# Altium footprint library eLIB.PcbLib: 206 footprints (part 7 of 13)
Each footprint in its own frame and in the unit in brackets; x right, y up, seen from the top. Pads: shape width x height; smd on the part's side, far side on the other; paste and mask are expansions set on the pad; w line width, h text height; cw(c..) or ccw(c..) is an arc to the next point about the centre after c.
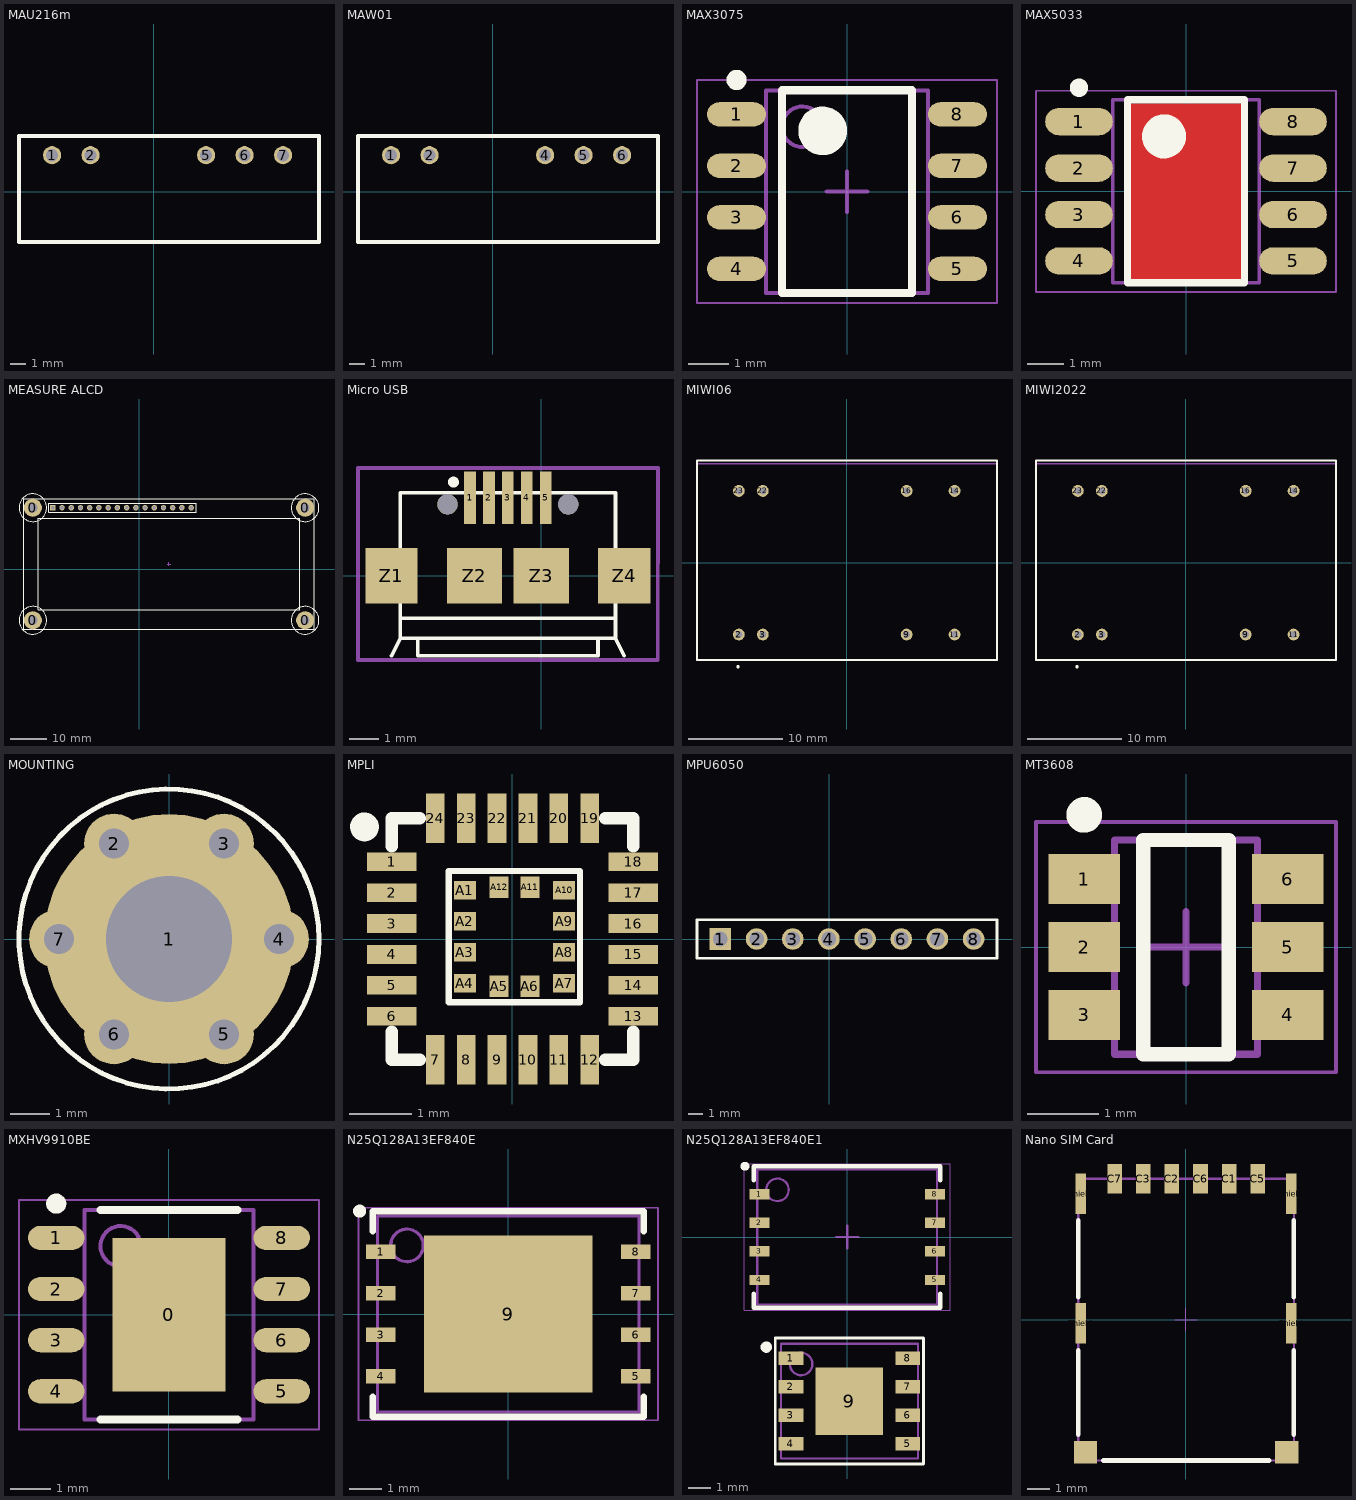
[diagram p6: the footprints below, top view; thin cyan lines are the x and y axes]

## MAU216m [mm]
pads (5):
  round 1.2 hole 0.8: 1(-6.7,2.4) 2(-4.16,2.4) 5(3.46,2.4) 6(6,2.4) 7(8.54,2.4)
Top Overlay:
  lines w0.254: -8.88,-3.33 -8.88,3.67 10.91,3.67 10.91,-3.33 -8.88,-3.33
3D body "User Library-MAU.STEP": height 10.4, standoff -3, extent -8.73,-2.74 10.77,3.46

## MAW01 [mm]
pads (5):
  round 1.2 hole 0.8: 1(-6.7,2.4) 2(-4.16,2.4) 4(3.46,2.4) 5(6,2.4) 6(8.54,2.4)
Top Overlay:
  lines w0.254: -8.88,-3.33 10.91,-3.33 10.91,3.67 -8.88,3.67 -8.88,-3.33
3D body "User Library-MAU.STEP": height 10.4, standoff -3, extent -8.73,-2.74 10.77,3.46

## MAX3075 [mm]
pads (8):
  oval 1.45x0.6 smd: 1(-2.725,1.905) 2(-2.725,0.635) 3(-2.725,-0.635) 4(-2.725,-1.905) 5(2.725,-1.905) 6(2.725,-0.635) 7(2.725,0.635) 8(2.725,1.905)
Top Overlay:
  circle w0.6: c-0.6,1.5 r0.3
  circle w0.25: c-2.725,2.755 r0.125
  lines w0.2: -1.6,-2.5 1.6,-2.5 1.6,2.5 -1.6,2.5 -1.6,-2.5
Mechanical 13:
  circle w0.1: c-1.1,1.6 r0.5
  lines w0.1: -2,-2.5 2,-2.5 2,2.5 -2,2.5 -2,-2.5
Mechanical 15:
  lines w0.05: -3.7,-2.75 3.7,-2.75 3.7,2.75 -3.7,2.75 -3.7,-2.75
  lines w0.1: -0.5,0 0.5,0 ; 0,-0.5 0,0.5
3D body: height 1.75, standoff 0.1, extent -2,-2.5 2,2.5

## MAX5033 [mm] "SOIC, 8-Leads, Body 4.90x3.90mm, Pitch 1.27mm, IPC Medium Density"
height 1.35
pads (8):
  oval 1.85x0.75 smd: 1(-2.925,1.905) 2(-2.925,0.635) 3(-2.925,-0.635) 4(-2.925,-1.905) 5(2.925,-1.905) 6(2.925,-0.635) 7(2.925,0.635) 8(2.925,1.905)
Top Layer:
  rectangle: -1.5,-2.4 1.5,2.4
Top Overlay:
  circle w0.25: c-2.925,2.83 r0.125
  circle w0.6: c-0.6,1.5 r0.3
  lines w0.2: -1.6,-2.5 -1.6,2.5 1.6,2.5 1.6,-2.5 -1.6,-2.5
Mechanical 13:
  circle w0.1: c-1.1,1.6 r0.5
  lines w0.1: -2,-2.5 -2,2.5 2,2.5 2,-2.5 -2,-2.5
Mechanical 15:
  lines w0.05: -4.1,-2.75 -4.1,2.75 4.1,2.75 4.1,-2.75 -4.1,-2.75
  lines w0.1: -0.5,0 0.5,0 ; 0,-0.5 0,0.5
3D body "LM358.step": height 1.35, standoff 0, extent -3.25,-2.5 3.25,2.5

## MEASURE ALCD [mm]
pads (20):
  round 5 hole 2.5: 0(-29.285,-14.023) 0(-29.285,16.977) 0(45.715,-14.023) 0(45.715,16.977)
  rect 1.5x1.5 hole 1: 1(-23.785,16.977)
  round 1.5 hole 1: 2(-21.245,16.977) 3(-18.705,16.977) 4(-16.165,16.977) 5(-13.625,16.977) 6(-11.085,16.977) 7(-8.545,16.977) 8(-6.005,16.977) 9(-3.465,16.977) 10(-0.925,16.977) 11(1.615,16.977) 12(4.155,16.977) 13(6.695,16.977) 14(9.235,16.977) 15(11.775,16.977) 16(14.315,16.977)
Top Overlay:
  circle w0.127: c-29.285,16.977 r3.81
  circle w0.127: c-29.285,-14.023 r3.81
  circle w0.127: c45.715,-14.023 r3.81
  circle w0.127: c45.715,16.977 r3.81
  lines w0.1: -27.853,-11.173 -27.853,14.127 44.283,14.127 44.283,-11.173 -27.853,-11.173
  lines w0.2: -31.78,-16.56 -31.78,19.5 48.18,19.5 48.18,-16.56 -31.78,-16.56 ; -24.894,15.674 -24.894,18.214 15.746,18.214 15.746,15.674 -24.894,15.674
Mechanical 15:
  lines w0.1: 7.715,1.477 8.715,1.477 ; 8.215,0.977 8.215,1.977
3D body: height 6, standoff 5, extent -33.314,-18.081 49.744,21.035
3D body: height 14, standoff 5, extent -27.853,-11.173 44.283,-4.111
3D body: height 14, standoff 5, extent -27.853,7.065 44.283,14.127
3D body: height 14, standoff 5, extent -23.789,-4.111 40.215,7.065
3D body: height 14, standoff 5, extent 40.219,-11.096 44.283,14.05
3D body: height 14, standoff 5, extent -27.853,-11.096 -23.789,14.05

## Micro USB [mm] "5 pins"
height 3
pads (11):
  rect 0.4x1.8 smd: 1(-2.45,2.675) 2(-1.8,2.675) 3(-1.15,2.675) 4(-0.5,2.675) 5(0.15,2.675)
  rect 1.8x1.9 smd: Z1(-5.15,0) Z4(2.85,0)
  rect 1.9x1.9 smd: Z2(-2.3,0) Z3(0,0)
  round 0.7 hole 0.7 unplated: ""(-3.225,2.45) ""(0.925,2.45)
Top Overlay:
  circle w0.254: c-3.02,3.215 r0.06
  lines w0.127: -5.15,-2.753 -4.85,-2.153 ; -4.85,-1.463 2.55,-1.463 ; -4.25,-2.153 -4.25,-2.75 1.95,-2.75 1.95,-2.153 ; 2.85,-2.753 2.55,-2.153 ; -4.85,-2.153 2.55,-2.153 ; -4.85,-2.153 -4.85,2.847 2.55,2.847 2.55,-2.153
Mechanical 15:
  lines w0.127: 4,3.7 -6.3,3.7 -6.3,-2.896 4,-2.896 4.01,3.7
3D body "629105136821.stp": height 2.69, standoff -0.61, extent -5.15,-2.756 2.85,3.148

## MIWI06 [mm]
pads (8):
  round 1.25 hole 0.75: 2(-11.43,-7.61) 3(-8.89,-7.61) 9(6.35,-7.61) 11(11.43,-7.61) 14(11.43,7.61) 16(6.35,7.61) 22(-8.89,7.61) 23(-11.43,7.61)
Top Overlay:
  circle w0.2: c-11.521,-11.036 r0.082
  lines w0.2: -15.87,-10.298 -15.87,10.85 15.93,10.85 15.93,-10.298 -15.87,-10.298
Mechanical 13:
  lines w0.2: -15.87,-10.298 -15.87,10.494 15.93,10.494 15.93,-10.298 -15.87,-10.298
3D body "MIW4022.STEP": height 10.1, standoff -4, extent -15.51,-9.62 14.99,10.88

## MIWI2022 [mm]
pads (8):
  round 1.25 hole 0.75: 2(-11.43,-7.61) 3(-8.89,-7.61) 9(6.35,-7.61) 11(11.43,-7.61) 14(11.43,7.61) 16(6.35,7.61) 22(-8.89,7.61) 23(-11.43,7.61)
Top Overlay:
  circle w0.2: c-11.521,-11.036 r0.082
  lines w0.2: -15.87,-10.298 -15.87,10.85 15.93,10.85 15.93,-10.298 -15.87,-10.298
Mechanical 13:
  lines w0.2: -15.87,-10.298 -15.87,10.494 15.93,10.494 15.93,-10.298 -15.87,-10.298
3D body "MIW4022.STEP": height 10, standoff -4, extent -15.06,-9.71 15.44,10.79

## MOUNTING [mil] "3mm screw mounting"
pads (7):
  round 250 hole 125.98: 1(0,0)
  round 60 hole 30: 2(-55,95.26) 3(55,95.26) 4(110,0) 5(55,-95.26) 6(-55,-95.26) 7(-110,0)
Top Overlay:
  circle w5: c0,0 r150

## MPLI [mm] "MPU-6050 & LIS2HH integerated ICs"
pads (36):
  rect 0.8x0.3 smd: 1(-1.95,1.25) 2(-1.95,0.75) 3(-1.95,0.25) 4(-1.95,-0.25) 5(-1.95,-0.75) 6(-1.95,-1.25) 13(1.95,-1.25) 14(1.95,-0.75) 15(1.95,-0.25) 16(1.95,0.25) 17(1.95,0.75) 18(1.95,1.25)
  rect 0.3x0.8 smd: 7(-1.25,-1.95) 8(-0.75,-1.95) 9(-0.25,-1.95) 10(0.25,-1.95) 11(0.75,-1.95) 12(1.25,-1.95) 19(1.25,1.95) 20(0.75,1.95) 21(0.25,1.95) 22(-0.25,1.95) 23(-0.75,1.95) 24(-1.25,1.95)
  rect 0.35x0.3 smd: A1(-0.767,0.788) A2(-0.767,0.288) A3(-0.767,-0.212) A4(-0.767,-0.713) A7(0.833,-0.713) A8(0.833,-0.212) A9(0.833,0.288) A10(0.833,0.788)
  rect 0.3x0.35 smd: A5(-0.217,-0.763) A6(0.283,-0.763) A11(0.283,0.838) A12(-0.217,0.838)
Top Overlay:
  lines w0.1: -1.03,-1.02 -1.03,1.098 1.093,1.098 1.093,-1.02 -1.03,-1.02
  lines w0.2: -1.948,-1.5 -1.948,-1.95 -1.498,-1.95 ; -1.948,1.5 -1.948,1.95 -1.498,1.95 ; 1.5,-1.95 1.95,-1.95 1.95,-1.5 ; 1.5,1.95 1.95,1.95 1.95,1.5
  lines w0.254: -2.285,1.82 ccw(c-2.39,1.81) -2.285,1.807
3D body "User Library-mpu-6050_qfn-24-1.STEP": height 0.88, standoff -0.02, extent -2.225,-2.088 1.815,1.953
3D body "User Library-LGA12_LIS2DS12.STEP": height 0.96, standoff 0, extent -0.247,-5.812 1.753,-3.812

## MPU6050 [mm] "MPU6050 Accellator , Gyroscope"
pads (8):
  rect 1.52x1.52 hole 1.02: 1(-7.635,0.004)
  round 1.52 hole 1.02: 2(-5.095,0.004) 3(-2.555,0.004) 4(-0.015,0.004) 5(2.525,0.004) 6(5.065,0.004) 7(7.605,0.004) 8(10.145,0.004)
Top Overlay:
  lines w0.2: -6.74,-1.346 -0.91,-1.346 ; -6.74,1.354 -0.91,1.354 ; -4.2,-1.346 1.63,-1.346 ; -4.2,1.354 1.63,1.354 ; -3.45,-1.346 -9.28,-1.346 -9.28,1.354 -3.45,1.354 ; -1.66,-1.346 4.17,-1.346 ; -1.66,1.354 4.17,1.354 ; 0.88,-1.346 6.71,-1.346 ; 0.88,1.354 6.71,1.354 ; 3.42,-1.346 9.25,-1.346 ; 3.42,1.354 9.25,1.354 ; 5.96,-1.346 11.79,-1.346 11.79,1.354 5.96,1.354
3D body "User Library-MPU 6050 IMU.STEP": height 6.44, standoff -4.73, extent -9.427,-1.268 11.68,14.607

## MT3608 [mm] "SOT23, 6-Leads, Body 2.90x2.80mm, Pitch 0.95mm, IPC Medium Density"
height 1.1
pads (6):
  rect 1x0.7 smd: 1(-1.425,0.95) 2(-1.425,0) 3(-1.425,-0.95) 4(1.425,-0.95) 5(1.425,0) 6(1.425,0.95)
Top Overlay:
  circle w0.25: c-1.425,1.85 r0.125
  lines w0.2: -0.6,-1.5 -0.6,1.5 0.6,1.5 0.6,-1.5 -0.6,-1.5
Mechanical 13:
  lines w0.1: -1,-1.5 1,-1.5 1,1.5 -1,1.5 -1,-1.5
Mechanical 15:
  lines w0.05: -2.1,-1.75 2.1,-1.75 2.1,1.75 -2.1,1.75 -2.1,-1.75
  lines w0.1: -0.5,0 0.5,0 ; 0,-0.5 0,0.5
3D body "PRTR5V0U4D.stp": height 1, standoff 0, extent -1.365,-1.46 1.385,1.44

## MXHV9910BE [mm]
pads (9):
  rect 2.8x3.81 smd: 0(0,0)
  oval 1.4x0.6 smd: 1(-2.8,1.905) 2(-2.8,0.635) 3(-2.8,-0.635) 4(-2.8,-1.905) 5(2.8,-1.905) 6(2.8,-0.635) 7(2.8,0.635) 8(2.8,1.905)
Top Overlay:
  circle w0.25: c-2.8,2.755 r0.125
  lines w0.2: -1.7,-2.6 1.7,-2.6 ; -1.7,2.6 1.7,2.6
Mechanical 13:
  circle w0.1: c-1.2,1.7 r0.5
  lines w0.1: -2.1,-2.6 -2.1,2.6 2.1,2.6 2.1,-2.6 -2.1,-2.6
Mechanical 15:
  lines w0.05: -3.725,-2.85 -3.725,2.85 3.725,2.85 3.725,-2.85 -3.725,-2.85
  lines w0.1: -0.5,0 0.5,0 ; 0,-0.5 0,0.5
3D body: height 1.43, standoff 0.05, extent -2.1,-2.6 2.1,2.6

## N25Q128A13EF840E [mm] "PQFN, 8-Leads, Body 6.00x5.00mm, Pitch 1.27mm, Thermal Pad 3.00x3.00mm,Micron Serial NOR Flash Memory"
height 0.9
pads (9):
  rect 0.9x0.45 smd: 1(-3.905,1.905) 2(-3.905,0.635) 3(-3.905,-0.635) 4(-3.905,-1.905) 5(3.905,-1.905) 6(3.905,-0.635) 7(3.905,0.635) 8(3.905,1.905)
  rect 5.16x4.8 smd: 9(0,0)
Top Overlay:
  circle w0.3: c-4.55,3.15 r0.05
  lines w0.2: -4.15,-2.53 -4.15,-3.15 4.15,-3.15 4.15,-2.53 ; -4.15,2.53 -4.15,3.15 4.15,3.15 4.15,2.53
Top Assembly:
  circle w0.1: c-3.1,2.1 r0.5
  lines w0.1: -4,-3 -4,3 4,3 4,-3 -4,-3
Top Courtyard:
  lines w0.05: -4.585,-3.25 -4.585,3.25 4.585,3.25 4.585,-3.25 -4.585,-3.25
  lines w0.1: -0.5,0 0.5,0 ; 0,-0.5 0,0.5
3D body "N25Q128A13EF840E1.step": height 0.85, standoff 0.05, extent -4,-3 4,3

## N25Q128A13EF840E1 [mm] "V-PDFN-8 8mm x 6mm (MLP8) � Package Code: F8"
height 0.85
pads (17):
  rect 0.9x0.45 smd: 1(-3.905,1.905) 2(-3.905,0.635) 3(-3.905,-0.635) 4(-3.905,-1.905) 5(3.905,-1.905) 6(3.905,-0.635) 7(3.905,0.635) 8(3.905,1.905)
  rect 1.1x0.6 smd: 1(-2.5,-5.395) 2(-2.5,-6.665) 3(-2.5,-7.935) 4(-2.5,-9.205) 5(2.7,-9.205) 6(2.7,-7.935) 7(2.7,-6.665) 8(2.7,-5.395)
  rect 3x3 smd: 9(0.1,-7.3)
Top Overlay:
  circle w0.25: c-3.6,-4.9 r0.125
  circle w0.3: c-4.55,3.15 r0.05
  lines w0.127: -3.2,-10.1 3.4,-10.1 3.4,-4.5 -3.2,-4.5 -3.2,-10.1
  lines w0.2: -4.15,-2.53 -4.15,-3.15 4.15,-3.15 4.15,-2.53 ; -4.15,2.53 -4.15,3.15 4.15,3.15 4.15,2.53
Top Assembly:
  circle w0.1: c-3.1,2.1 r0.5
  lines w0.1: -4,-3 -4,3 4,3 4,-3 -4,-3
Top Courtyard:
  lines w0.05: -4.585,-3.25 -4.585,3.25 4.585,3.25 4.585,-3.25 -4.585,-3.25
  lines w0.1: -0.5,0 0.5,0 ; 0,-0.5 0,0.5
Mechanical 13:
  circle w0.1: c-2.05,-5.65 r0.5
  lines w0.1: -2.95,-9.85 -2.95,-4.75 3.15,-4.75 3.15,-9.85 -2.95,-9.85
Mechanical 15:
  lines w0.1: -0.4,-7.3 0.6,-7.3 ; 0.1,-7.8 0.1,-6.8
3D body "N25Q128A13EF840E1.step": height 0.85, standoff 0.05, extent -4,-3 4,3
3D body: height 0.9, standoff 0, extent -2.95,-9.85 3.15,-4.75

## Nano SIM Card [mm] "Nano SIM Card Connector Push & Pull - 6 Pins, 693043020611"
height 1.2
pads (12):
  rect 0.65x1.3 smd: C1(1.915,6.25) C2(-0.625,6.25) C3(-1.895,6.25) C5(3.185,6.25) C6(0.645,6.25) C7(-3.165,6.25)
  rect 0.48x1.8 smd: Shield(-4.665,-0.17) Shield(-4.665,5.58) Shield(4.665,-0.17) Shield(4.665,5.58)
  rect 1.03x1 smd: Shield(-4.46,-5.89) Shield(4.47,-5.89)
Top Overlay:
  lines w0.2: -4.775,-5.1 -4.775,-1.35 ; -4.775,1 -4.775,4.4 ; -3.665,-6.25 3.685,-6.25 ; 4.785,-5.1 4.785,-1.35 ; 4.785,1 4.785,4.4
Mechanical 13:
  lines w0.1: -4.775,-6.25 4.785,-6.25 4.785,6.25 -4.775,6.25 -4.775,-6.25
Mechanical 15:
  lines w0.05: -0.5,0 0.5,0 ; 0,-0.5 0,0.5
3D body "693043020611.stp": height 1.2, standoff -0.01, extent -4.926,-6.25 4.936,6.25